# Altium footprint library 电阻封装库.PcbLib: 54 footprints (part 4 of 4)
Each footprint in its own frame and in the unit in brackets; x right, y up, seen from the top. Pads: shape width x height; smd on the part's side, far side on the other; paste and mask are expansions set on the pad; w line width, h text height; cw(c..) or ccw(c..) is an arc to the next point about the centre after c.
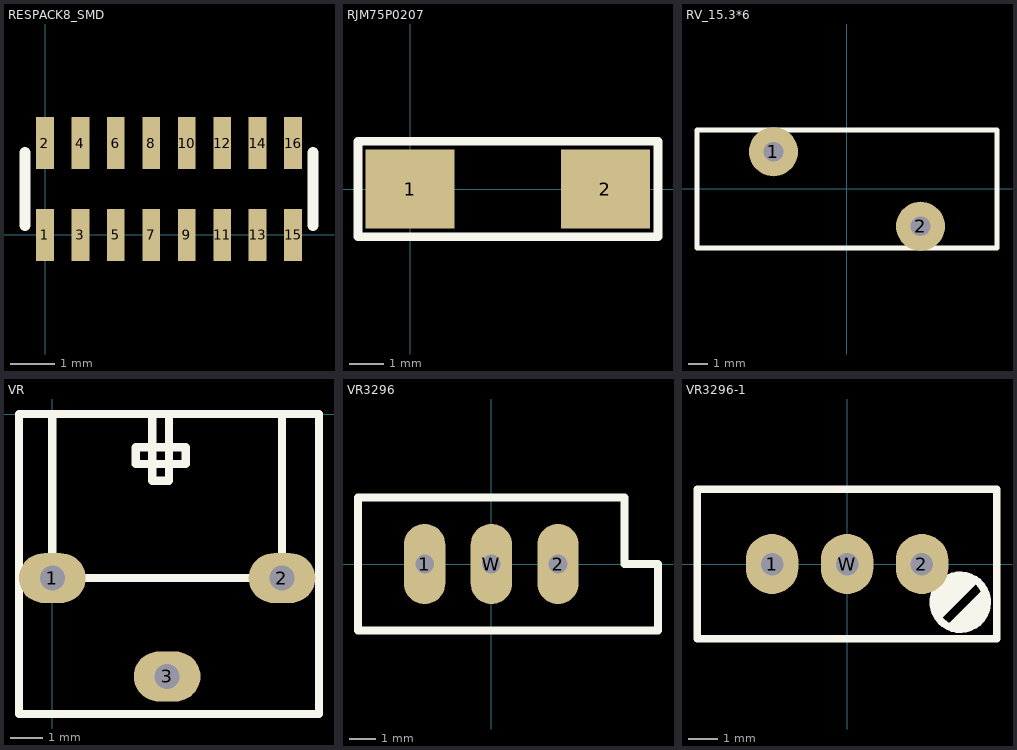
[diagram p3: the footprints below, top view; thin cyan lines are the x and y axes]

## RESPACK8_SMD [mm]
pads (16):
  rect 0.4x1.174 smd: 1(-0.006,0) 2(-0.006,2.074) 3(0.794,0) 4(0.794,2.074) 5(1.594,0) 6(1.594,2.074) 7(2.394,0) 8(2.394,2.074) 9(3.194,0) 10(3.194,2.074) 11(3.994,0) 12(3.994,2.074) 13(4.794,0) 14(4.794,2.074) 15(5.594,0) 16(5.594,2.074)
Top Overlay:
  lines w0.254: -0.456,0.212 -0.456,1.862 ; 6.044,0.212 6.044,1.862

## RJM75P0207 [mm] "晶圆电阻"
height 2.3
pads (2):
  rect 2.6x2.3 smd: 1(0,0) 2(5.7,0)
Top Overlay:
  lines w0.254: -1.524,-1.397 7.239,-1.397 7.239,1.397 -1.524,1.397 -1.524,-1.397

## RV_15.3*6 [mm]
pads (2):
  round 2.5 hole 1: 1(-3.75,1.899) 2(3.75,-1.901)
Top Overlay:
  lines w0.254: -7.65,-3.001 -7.65,2.999 7.65,2.999 7.65,-3.001 -7.65,-3.001

## VR [mil]
pads (3):
  oval 80x60 hole 30: 1(0,-196.85) 2(275.59,-196.85) 3(137.8,-314.96)
Top Overlay:
  lines w10: 120,0 120,-80 140,-80 140,0 ; 0,0 -40,0 -40,-360 320,-360 320,-300 320,0 275.59,0 ; 0,0 0,-196.85 275.59,-196.85 275.59,0 ; 0,0 275.59,0 ; 100,-60 100,-40 160,-40 160,-60 100,-60

## VR3296 [mil]
pads (3):
  oval 62x120 hole 28: 1(-100,0) 2(100,0) W(0,0)
Top Overlay:
  lines w12: -200,-100 -200,100 200,100 200,0 250,0 250,-100 -200,-100

## VR3296-1 [mil]
pads (3):
  oval 70x80 hole 30: 1(-100,0) 2(100,0) W(0,0)
Top Overlay:
  circle w10: c151,-51 r36.06
  lines w10: 157.76,-74.24 164.24,-74.24 171,-81 ; 171,-21 151,-41 121,-71 121,-61 161,-21 141,-21 ; 172.88,-79.12 171,-81 ; 181,-41 141,-81 151,-81 ; 131,-31 141,-31 ; 131,-31 141,-21 ; 131,-31 121,-41 121,-51 141,-31 ; 141,-31 151,-31 141,-21 ; 141,-31 141,-21 ; 151,-81 166.82,-65.18 172.88,-65.18 187.06,-51 187.06,-47.06 172.88,-61.23 170.77,-61.23 171,-61.47 171,-81 ; 151,-81 171,-81 ; -200,-100 -200,100 200,100 200,-100 0,-100 -200,-100